# Altium schematic symbol library lib_datalogger.SchLib: 1246 symbols (part 14 of 16)
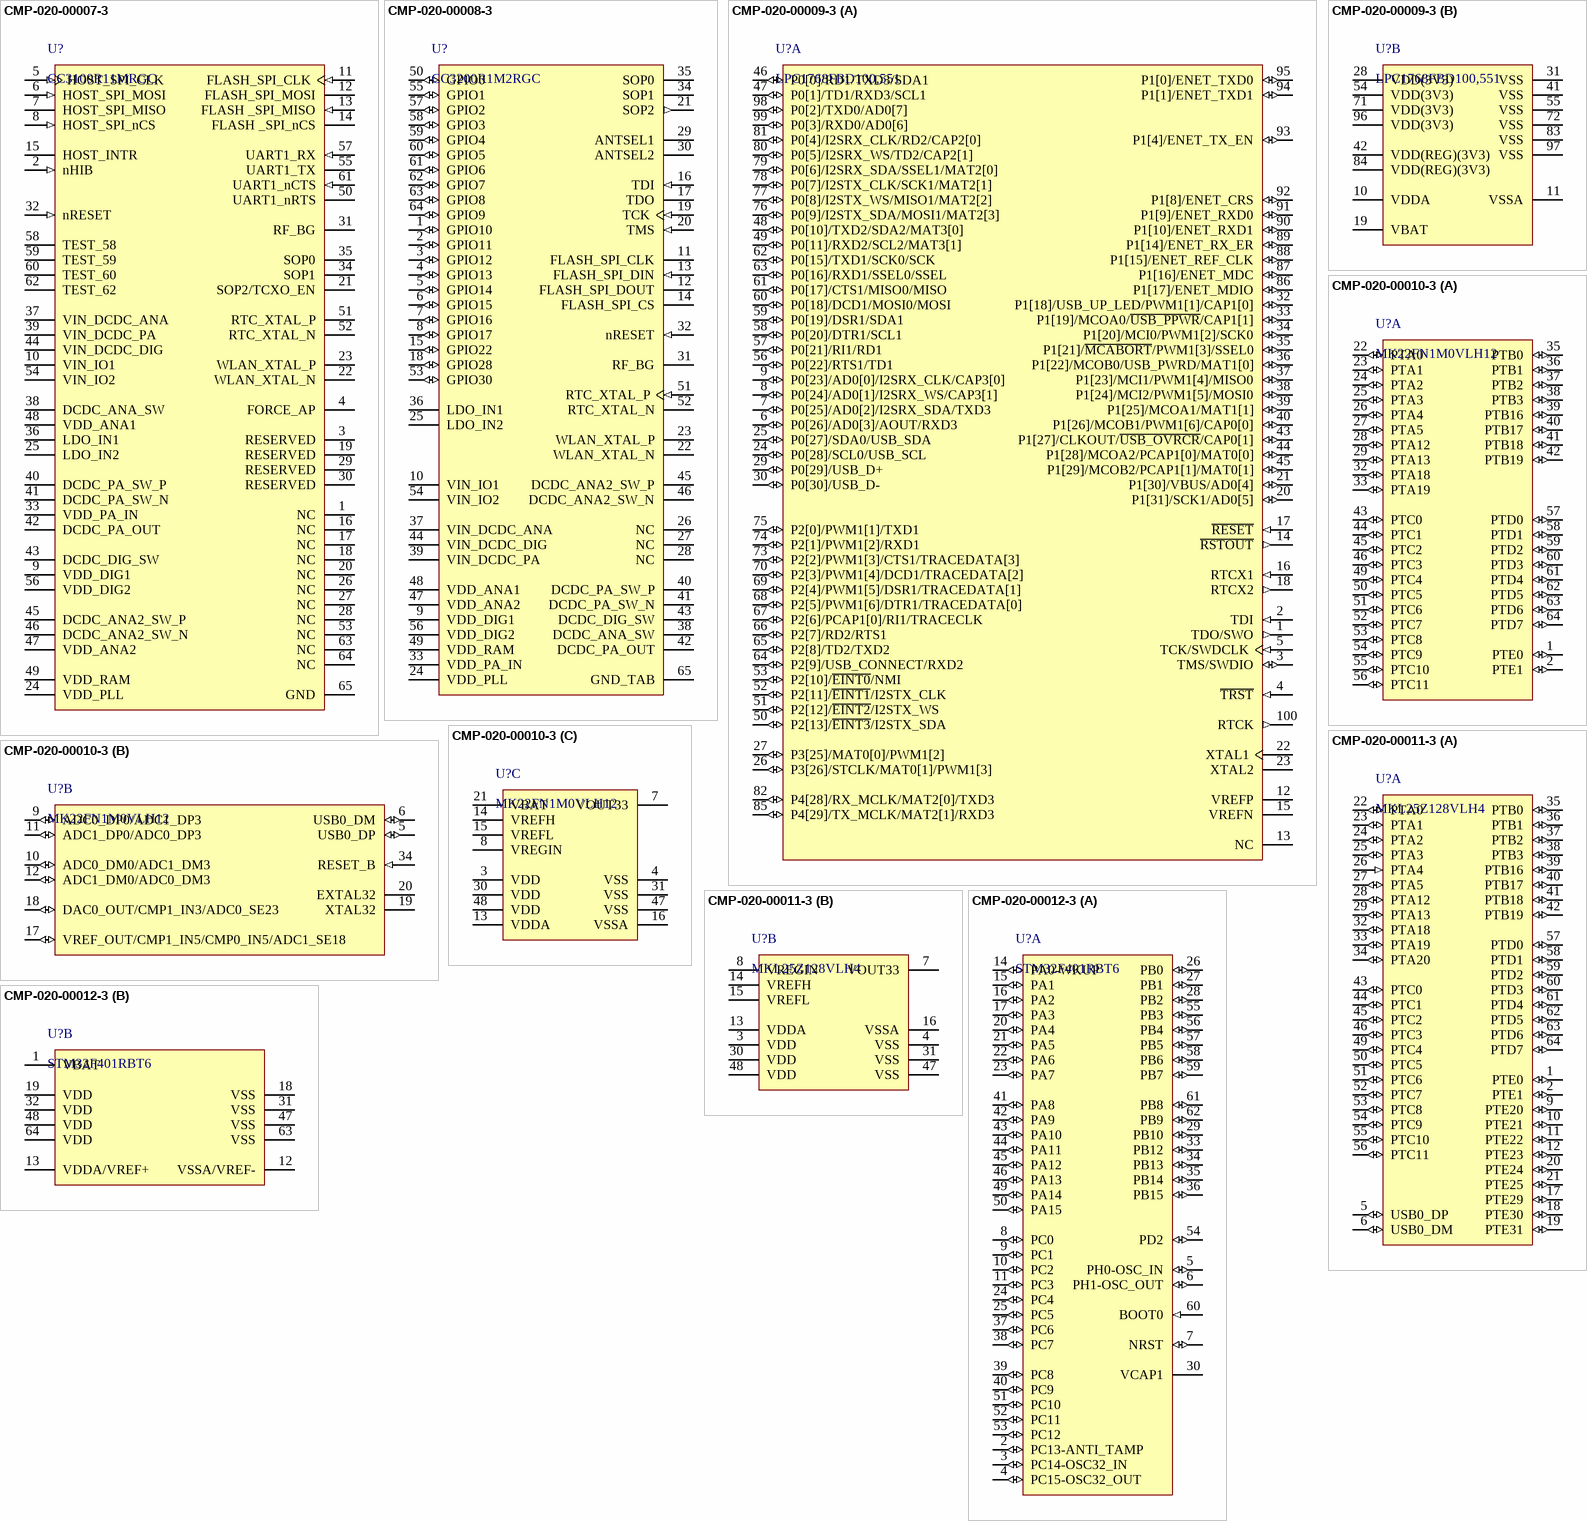
[diagram p56: symbols CMP-020-00007-3 to CMP-020-00012-3]

## CMP-020-00010-3
designator U?, comment MK22FN1M0VLH12
Kinetis K22F Sub-Family, 120 MHz ARM(R) Cortex(R)-M4-based Microcontroller with FPU, 1.71 to 3.6 V, -40 to 105 degC, 64-Pin LQFP, RoHS, Tray; Manufacturer: Freescale; Max Supply Voltage: 3.6V; Density: 1MB; Package Version: Rev. G, 01/2016; RAM Size: 128KB; Max Clock Frequency: 120MHz; Interface: UART; Min Supply Voltage: 1.71V; Datasheet Version: Rev. 4, 11/2014; Package Quantity: 160; Package Reference: LQFP-64; Package Description: 64-Pin Low-profile Quad Flat Package, Body 10 x 10 mm, Pitch 0.5 mm; Mounting Technology: SM; Max Operating Temperature: 105°C; Datasheet URL: http://cache.nxp.com/files/32bit/doc/data_sheet/K22P64M120SF5.pdf; Min Operating Temperature: -40°C; RoHS Compliant: True; Case/Package: LQFP; Packaging: Tray; Package URL: http://cache.nxp.com/files/shared/doc/package_info/98ASS23234W.pdf?fsrch=1&sr=1&pageNum=1; Manufacturer URL: http://www.nxp.com/; Pins: 64
footprint FREE-LQFP-64_M (TSQFP, 64-Leads, Body 10.00x10.00mm, Pitch 0.50mm, IPC Low Density)
footprint FREE-LQFP-64_L (TSQFP, 64-Leads, Body 10.00x10.00mm, Pitch 0.50mm, IPC High Density)
footprint FREE-LQFP-64_N (TSQFP, 64-Leads, Body 10.00x10.00mm, Pitch 0.50mm, IPC Medium Density)
part A pins: 1 PTE0 (io) "ADC1_SE4A/UART1_TX/TRACE_CLKOUT/I2C1_SDA/RTC_CLKOUT", 2 PTE1 (io) "LLWU_P0/ADC1_SE5A/UART1_RX/TRACE_D3/I2C1_SCL", 22 PTA0 (io) "UART0_CTS_B/FTM0_CH5/JTAG_TCLK/SWD_CLK/EZP_CLK", 23 PTA1 (io) "UART0_RX/FTM0_CH6/JTAG_TDI/EZP_DI", 24 PTA2 (io) "UART0_TX/FTM0_CH7/JTAG_TDO/TRACE_SWO/EZP_DO", 25 PTA3 (io) "UART0_RTS_B/FTM0_CH0/JTAG_TMS/SWD_DIO", 26 PTA4 (io) "LLWU_P3/FTM0_CH1/NMI_B/EZP_CS_B", 27 PTA5 (io) "USB_CLKIN/FTM0_CH2/CMP2_OUT/2S0_TX_BCLK/JTAG_TRST_B", 28 PTA12 (io) "CMP2_IN0/CAN0_TX/FTM1_CH0/I2C2_SCL/I2S0_TXD0/FTM1_QD_PHA", 29 PTA13 (io) "LLWU_P4/CMP2_IN1/CAN0_RX/FTM1_CH1/I2C2_SDA/I2S0_TX_FS/FTM1_QD_PHB", 32 PTA18 (io) "EXTAL0/FTM0_FLT2/FTM_CLKIN0", 33 PTA19 (io) "XTAL0/FTM1_FLT0/FTM_CLKIN1/LPTMR0_ALT1", 35 PTB0 (io) "LLWU_P5/ADC0_SE8/ADC1_SE8/I2C0_SCL/FTM1_CH0/FTM1_QD_PHA", 36 PTB1 (io) "ADC0_SE9/ADC1_SE9/PTB1/I2C0_SDA/FTM1_CH1/FTM1_QD_PHB", 37 PTB2 (io) "ADC0_SE12/I2C0_SCL/UART0_RTS_B/FTM0_FLT3", 38 PTB3 (io) "ADC0_SE13/I2C0_SDA/UART0_CTS_B/FTM0_FLT0", 39 PTB16 (io) "UART0_RX/FTM_CLKIN0/FB_AD17/EWM_IN", 40 PTB17 (io) "UART0_TX/FTM_CLKIN1/FB_AD16/EWM_OUT_B", 41 PTB18 (io) "CAN0_TX/FTM2_CH0/I2S0_TX_BCLK/FB_AD15/FTM2_QD_PHA", 42 PTB19 (io) "CAN0_RX/FTM2_CH1/I2S0_TX_FS/FB_OE_B/FTM2_QD_PHB", 43 PTC0 (io) "ADC0_SE14/SPI0_PCS4/PDB0_EXTRG/FB_AD14/I2S0_TXD1", 44 PTC1 (io) "LLWU_P6/ADC0_SE15/SPI0_PCS3/UART1_RTS_B/ FTM0_CH0/FB_AD13/I2S0_TXD0", 45 PTC2 (io) "ADC0_SE4B/CMP1_IN0/SPI0_PCS2/UART1_CTS_B/FTM0_CH1/FB_AD12/I2S0_TX_FS", 46 PTC3 (io) "LLWU_P7/CMP1_IN1/SPI0_PCS1/UART1_RX/FTM0_CH2/CLKOUT/I2S0_TX_BCLK", 49 PTC4 (io) "LLWU_P8/SPI0_PCS0/UART1_TX/FTM0_CH3/FB_AD11/CMP1_OUT", 50 PTC5 (io) "LLWU_P9/SPI0_SCK/LPTMR0_ALT2/I2S0_RXD0/FB_AD10/CMP0_OUT/FTM0_CH2", 51 PTC6 (io) "LLWU_P10/CMP0_IN0/SPI0_SOUT/PDB0_EXTRG/I2S0_RX_BCLK/FB_AD9/I2S0_MCLK", 52 PTC7 (io) "CMP0_IN1/SPI0_SIN/USB_SOF_OUT/I2S0_RX_FS/FB_AD8", 53 PTC8 (io) "ADC1_SE4B/CMP0_IN2/FTM3_CH4/I2S0_MCLK/FB_AD7", 54 PTC9 (io) "ADC1_SE5B/CMP0_IN3/FTM3_CH5/I2S0_RX_BCLK/FB_AD6/FTM2_FLT0", 55 PTC10 (io) "ADC1_SE6B/I2C1_SCL/FTM3_CH6/I2S0_RX_FS/FB_AD5", 56 PTC11 (io) "LLWU_P11/ADC1_SE7B/I2C1_SDA/FTM3_CH7/I2S0_RXD1/FB_RW_B", 57 PTD0 (io) "LLWU_P12/SPI0_PCS0/UART2_RTS_B/FTM3_CH0/FB_ALE/FB_CS1_B/FB_TS_B", 58 PTD1 (io) "ADC0_SE5B/SPI0_SCK/UART2_CTS_B/FTM3_CH1/FB_CS0_B", 59 PTD2 (io) "LLWU_P13/SPI0_SOUT/UART2_RX/FTM3_CH2/FB_AD4/I2C0_SCL", 60 PTD3 (io) "SPI0_SIN/UART2_TX/FTM3_CH3/FB_AD3/I2C0_SDA", 61 PTD4 (io) "LLWU_P14/SPI0_PCS1/UART0_RTS_B/FTM0_CH4/FB_AD2/EWM_IN", 62 PTD5 (io) "ADC0_SE6B/SPI0_PCS2/UART0_CTS_ B/FTM0_CH5/FB_AD1/EWM_OUT_B", 63 PTD6 (io) "LLWU_P15/ADC0_SE7B/SPI0_PCS3/UART0_RX/FTM0_CH6/FB_AD0/FTM0_FLT0", 64 PTD7 (io) "CMT_IRO/UART0_TX/FTM0_CH7/FTM0_FLT1"
part B pins: 5 USB0_DP (io), 6 USB0_DM (io), 9 ADC0_DP0/ADC1_DP3 (io), 10 ADC0_DM0/ADC1_DM3 (io), 11 ADC1_DP0/ADC0_DP3 (io), 12 ADC1_DM0/ADC0_DM3 (io), 17 VREF_OUT/CMP1_IN5/CMP0_IN5/ADC1_SE18 (io), 18 DAC0_OUT/CMP1_IN3/ADC0_SE23 (io), 19 XTAL32, 20 EXTAL32, 34 RESET_B (in)
part C pins: 3 VDD (power) "Digital supply voltage", 4 VSS (power), 7 VOUT33 (power), 8 VREGIN (power) "Input supply voltage", 13 VDDA (power) "Analog supply voltage", 14 VREFH (power) "ADC reference  voltage high", 15 VREFL (power) "ADC reference  voltage low", 16 VSSA (power), 21 VBAT (power) "RTC battery supply voltage", 30 VDD (power) "Digital supply voltage", 31 VSS (power), 47 VSS (power), 48 VDD (power) "Digital supply voltage"

## CMP-020-00011-3
designator U?, comment MKL25Z128VLH4
48 MHz Cortex-M0+ Based Microcontroller with USB, 1.71 to 3.6 V, -40 to 105 degC, 64-Pin LQFP, RoHS, Tray; Manufacturer: Freescale; I/Os: 50; Package Version: Rev. G, 01/2016; Frequency: 48MHz; Max Supply Voltage: 3.6V; Density: 128KB; ADC Channels: 14; Min Supply Voltage: 1.71V; PWM Channels: 6; Interface: UART; RAM Size: 16KB; Package Description: 64-Pin Low-profile Quad Flat Package, Body 10 x 10 mm, Pitch 0.5 mm; Package Quantity: 160; RoHS Compliant: True; Package Reference: LQFP-64; Min Operating Temperature: -40°C; Package URL: http://cache.nxp.com/files/shared/doc/package_info/98ASS23234W.pdf?fsrch=1&sr=1&pageNum=1; Packaging: Tray; Max Operating Temperature: 105°C; Pins: 64; Max Clock Frequency: 48MHz; Manufacturer URL: http://www.nxp.com/; Case/Package: LQFP; Datasheet URL: http://cache.freescale.com/files/32bit/doc/data_sheet/KL25P80M48SF0.pdf; Datasheet Version: Rev. 5, 08/2014; Mounting Technology: SM
footprint FREE-LQFP-64_M (TSQFP, 64-Leads, Body 10.00x10.00mm, Pitch 0.50mm, IPC Low Density)
footprint FREE-LQFP-64_L (TSQFP, 64-Leads, Body 10.00x10.00mm, Pitch 0.50mm, IPC High Density)
footprint FREE-LQFP-64_N (TSQFP, 64-Leads, Body 10.00x10.00mm, Pitch 0.50mm, IPC Medium Density)
part A pins: 1 PTE0 (io) "UART1_TX/RTC_CLKOUT/CMP0_OUT/I2C1_SDA", 2 PTE1 (io) "SPI1_MOSI/UART1_RX/SPI1_MISO/I2C1_SCL", 5 USB0_DP (io), 6 USB0_DM (io), 9 PTE20 (io) "ADC0_DP0/ADC0_SE0/TPM1_CH0/UART_TX", 10 PTE21 (io) "ADC0_DM0/ADC_SE4A/TPM1_CH1/UART0_RX", 11 PTE22 (io) "ADC0_DP3/ADC0_SE3/TPM2_CH0/UART2_TX", 12 PTE23 (io) "ADC0_DP3/ADC0_SE7A/TPM2_CH1/UART_RX", 17 PTE29 (io) "CMP0_IN5/ADC0_SE4B/TPM0_CH2/TPM_CLKIN0", 18 PTE30 (io) "DAC0_OUT/ADC0_SE23/CMP0_IN4/TPM0_CH3/TPM_CLKIN1", 19 PTE31 (io) "TPM0_CH4", 20 PTE24 (io) "TPM0_CH0/I2C0_SCL", 21 PTE25 (io) "TPM0_CH1/I2C0_SDA", 22 PTA0 (io) "TSI0_CH1/TPM0_CH5/SWD_CLK", 23 PTA1 (io) "TSI0_CH2/UART0_RX/TPM2_CH0", 24 PTA2 (io) "TSI0_CH3/UART0_TX/TPM2_CH1", 25 PTA3 (io) "TSI0_CH4/I2C1_SCL/TPM0_CH0/SWD_DIO", 26 PTA4 (in) "TSI0_CH5/I2C1_SDA/TPM0_CH1/NMI_B", 27 PTA5 (io) "USB_CLKIN/TPM0_CH2", 28 PTA12 (io) "TPM1_CH0", 29 PTA13 (io) "TPM1_CH1", 32 PTA18 (io) "EXTAL0/UART1_RX/TPM_CLKIN0", 33 PTA19 (io) "XTAL0/UART1_TX/TPM_CLKIN1/LPTMR0_ALT1", 34 PTA20 (io) "RESET_B", 35 PTB0 (io) "LLWU_P5/ADC0_SE8/TSI0_CH0/I2C0_SCL/TPM1_CH0", 36 PTB1 (io) "ADC0_SE9/TSI0_CH6/I2C0_SDA/TPM1_CH1", 37 PTB2 (io) "ADC0_SE12/TSI0_CH7/I2C0_SCL/TPM2_CH0", 38 PTB3 (io) "ADC0_SE13/TSI0_CH8/I2C0_SDA/TPM2_CH1", 39 PTB16 (io) "TSI0_CH9/SPI1_MOSI/UART0_RX/TPM_CLKIN0/SPI1_MISO", 40 PTB17 (io) "TSI0_CH10/SPI1_MISO/UART0_TX/TPM_CLKIN1/SPI1_MOSI", 41 PTB18 (io) "TSI0_CH11/TPM2_CH0", 42 PTB19 (io) "TSI0_CH12/TPM2_CH1", 43 PTC0 (io) "ADC0_SE14/TSI0_CH13/EXTRG_IN/CMP0_OUT", 44 PTC1 (io) "LLWU_P6/RTC_CLKIN/ADC0_SE15/TSI0_CH14/I2C1_SCL/TPM0_CH0", 45 PTC2 (io) "ADC0_SE11/TSI0_CH15/I2C1_SDA/TPM0_CH1", 46 PTC3 (io) "LLWU_P7/UART1_RX/TPM0_CH2/CLKOUT", 49 PTC4 (io) "LLWU_P8/SPI0_PCS0/UART1_TX/TPM0_CH3", 50 PTC5 (io) "LLWU_P9/SPI0_SCK/LPTMR0_ALT2/CMP0_OUT", 51 PTC6 (io) "LLWU_P10/CMP0_IN0/SPI0_MOSI/EXTRG_IN/SPI0_MISO", 52 PTC7 (io) "CMP0_IN1/SPI0_MISO/SPI0_MOSI", 53 PTC8 (io) "CMP0_IN2/I2C0_SCL/TPM0_CH4", 54 PTC9 (io) "CMP0_IN3/I2C0_SDA/TPM0_CH5", 55 PTC10 (io) "I2C1_SCL", 56 PTC11 (io) "I2C1_SDA", 57 PTD0 (io) "SPI0_PCS0/TPM0_CH0", 58 PTD1 (io) "ADC0_SE5B/PTD1/SPI0_SCK/TPM0_CH1", 59 PTD2 (io) "SPI0_MOSI/UART2_RX/TPM0_CH2/SPI0_MISO", 60 PTD3 (io) "SPI0_MISO/UART2_TX/TPM0_CH3/SPI0_MOSI", 61 PTD4 (io) "LLWU_P14/SPI1_PCS0/UART2_RX/TPM0_CH4", 62 PTD5 (io) "ADC0_SE6B/SPI1_SCK/UART2_TX/TPM0_CH5", 63 PTD6 (io) "LLWU_P15/ADC0_SE7B/SPI1_MOSI/UART0_RX/SPI1_MISO", 64 PTD7 (io) "SPI1_MISO/UART0_TX/SPI1_MOSI"
part B pins: 3 VDD (power) "Digital supply voltage", 4 VSS (power), 7 VOUT33 (power), 8 VREGIN (power) "USB regulator input", 13 VDDA (power) "Analog supply voltage", 14 VREFH (power) "ADC reference  voltage high", 15 VREFL (power) "ADC reference  voltage low", 16 VSSA (power), 30 VDD (power) "Digital supply voltage", 31 VSS (power), 47 VSS (power), 48 VDD (power) "Digital supply voltage"

## CMP-020-00012-3
designator U?, comment STM32F401RBT6
ARM Cortex -M4 32b MCU+FPU, 256 KB Flash, 64 KB RAM, -40 to 85 degC, 64-Pin LQFP, RoHS, Tray; Manufacturer: STMicroelectronics; Frequency: 84MHz; Interface: USART; Power: 313mW; Max Supply Voltage: 3.6V; RAM Size: 64KB; I/Os: 50; Density: 128KB; Min Supply Voltage: 1.8V; Datasheet URL: http://www.st.com/st-web-ui/static/active/en/resource/technical/document/datasheet/DM00086815.pdf; Package Quantity: 160; Package Description: 64-Pin Low-profile Quad Flat Package, Body 10 x 10 mm, Pitch 0.5 mm; Packaging: Tray; Case/Package: LQFP; Pins: 64; Mounting Technology: SM; RoHS Compliant: True; Datasheet Version: Rev. 5, 08/2015; Manufacturer URL: http://www.st.com/; Package Reference: LQFP64
footprint STM-LQFP64_L (Thin QFP, 64-Leads, Body 10x10mm, Pitch 0.5mm, IPC High Density)
footprint STM-LQFP64_M (Thin QFP, 64-Leads, Body 10x10mm, Pitch 0.5mm, IPC Low Density)
footprint STM-LQFP64_N (Thin QFP, 64-Leads, Body 10x10mm, Pitch 0.5mm, IPC Medium Density)
part A pins: 2 PC13-ANTI_TAMP (io) "PC13-ANTI_TAMP/TAMP_1", 3 PC14-OSC32_IN (io) "PC14-OSC32_IN/OSC32_IN", 4 PC15-OSC32_OUT (io) "PC15-OSC32_OUT/OSC32_OUT", 5 PH0-OSC_IN (io) "PH0-OSC_IN/OSC_IN", 6 PH1-OSC_OUT (io) "PH1-OSC_OUT/OSC_OUT", 7 NRST (io), 8 PC0 (io) "PC0/ADC1_10", 9 PC1 (io) "PC1/ADC1_11", 10 PC2 (io) "PC2/SPI2_MISO,I2S2ext_SD/ADC1_12", 11 PC3 (io) "PC3/SPI2_MOSI/I2S2_SD/ADC1_13", 14 PA0-WKUP (io) "PA0-WKUP/USART2_CTS,TIM2_CH1/TIM2_ETR,TIM5_CH1/ADC1_0,WKUP", 15 PA1 (io) "PA1/USART2_RTS,TIM2_CH2,TIM5_CH2/ADC1_1", 16 PA2 (io) "PA2/USART2_TX,TIM2_CH3,TIM5_CH3,TIM9_CH1/ADC1_2", 17 PA3 (io) "PA3/USART2_RX,TIM2_CH4,TIM5_CH4,TIM9_CH2/ADC1_3", 20 PA4 (io) "PA4/SPI1_NSS,SPI3_NSS/I2S3_WS,USART2_CK/ADC1_4", 21 PA5 (io) "PA5/SPI1_SCK,TIM2_CH1/TIM2_ETR/ADC1_5", 22 PA6 (io) "PA6/SPI1_MISO,TIM1_BKIN,TIM3_CH1/ADC1_6", 23 PA7 (io) "PA7/SPI1_MOSI,TIM1_CH1N,TIM3_CH2/ADC1_7", 24 PC4 (io) "PC4/ADC1_14", 25 PC5 (io) "PC5/ADC1_15", 26 PB0 (io) "PB0/TIM1_CH2N,TIM3_CH3/ADC1_8", 27 PB1 (io) "PB1/TIM1_CH3N,TIM3_CH4/ADC1_9", 28 PB2 (io), 29 PB10 (io) "PB10/SPI2_SCK/I2S2_CK,I2C2_SCL,TIM2_CH3", 30 VCAP1 (power), 33 PB12 (io) "PB12/SPI2_NSS/I2S2_WS,I2C2_SMBAL,TIM1_BKIN", 34 PB13 (io) "PB13/SPI2_SCK/I2S2_CK,TIM1_CH1N", 35 PB14 (io) "PB14/SPI2_MISO,I2S2ext_SD,TIM1_CH2N", 36 PB15 (io) "PB15/SPI2_MOSI/I2S2_SD,TIM1_CH3N,RTC_50Hz", 37 PC6 (io) "PC6/I2S2_MCK,USART6_TX,TIM3_CH1,SDIO_D6", 38 PC7 (io) "PC7/I2S3_MCK,USART6_RX,TIM3_CH2,SDIO_D7", 39 PC8 (io) "PC8/USART6_CK,TIM3_CH3,SDIO_D0", 40 PC9 (io) "PC9/I2S2_CKIN,I2C3_SDA,TIM3_CH4,SDIO_D1,MCO_2", 41 PA8 (io) "PA8/I2C3_SCL,USART1_CK,TIM1_CH1,USB_FS_SOF,MCO_1", 42 PA9 (io) "PA9/I2C3_SMBAL,USART1_TX,TIM1_CH2,USB_FS_VBUS", 43 PA10 (io) "PA10/USART1_RX,TIM1_CH3,USB_FS_ID", 44 PA11 (io) "PA11/USART1_CTS,USART6_TX,TIM1_CH4,USB_FS_DM", 45 PA12 (io) "PA12/USART1_RTS,USART6_RX,TIM1_ETR,USB_FS_DP", 46 PA13 (io) "PA13/JTMS-SWDIO", 49 PA14 (io) "PA14/JTCK-SWCLK", 50 PA15 (io) "PA15/SPI1_NSS,SPI3_NSS/I2S3_WS,TIM2_CH1/TIM2_ETR,JTDI", 51 PC10 (io) "PC10/SPI3_SCK/I2S3_CK,SDIO_D2", 52 PC11 (io) "PC11/I2S3ext_SD,SPI3_MISO,SDIO_D3", 53 PC12 (io) "PC12/SPI3_MOSI/I2S3_SD,SDIO_CK", 54 PD2 (io) "PD2/TIM3_ETR,SDIO_CMD", 55 PB3 (io) "PB3/SPI1_SCK,SPI3_SCK/I2S3_CK,I2C2_SDA,TIM2_CH2,JTDO-SWO", 56 PB4 (io) "PB4/SPI1_MISO,SPI3_MISO,I2S3ext_SD,I2C3_SDA,TIM3_CH1,JTRST", 57 PB5 (io) "PB5/SPI1_MOSI,SPI3_MOSI/I2S3_SD,I2C1_SMBAL,TIM3_CH2", 58 PB6 (io) "PB6/I2C1_SCL,USART1_TX,TIM4_CH1", 59 PB7 (io) "PB7/I2C1_SDA,USART1_RX,TIM4_CH2", 60 BOOT0 (in), 61 PB8 (io) "PB8/I2C1_SCL,TIM4_CH3,TIM10_CH1,SDIO_D4", 62 PB9 (io) "PB9/SPI2_NSS/I2S2_WS,I2C1_SDA,TIM4_CH4,TIM11_CH1,SDIO_D5"
part B pins: 1 VBAT (power), 12 VSSA/VREF- (power), 13 VDDA/VREF+ (power), 18 VSS (power), 19 VDD (power), 31 VSS (power), 32 VDD (power), 47 VSS (power), 48 VDD (power), 63 VSS (power), 64 VDD (power)

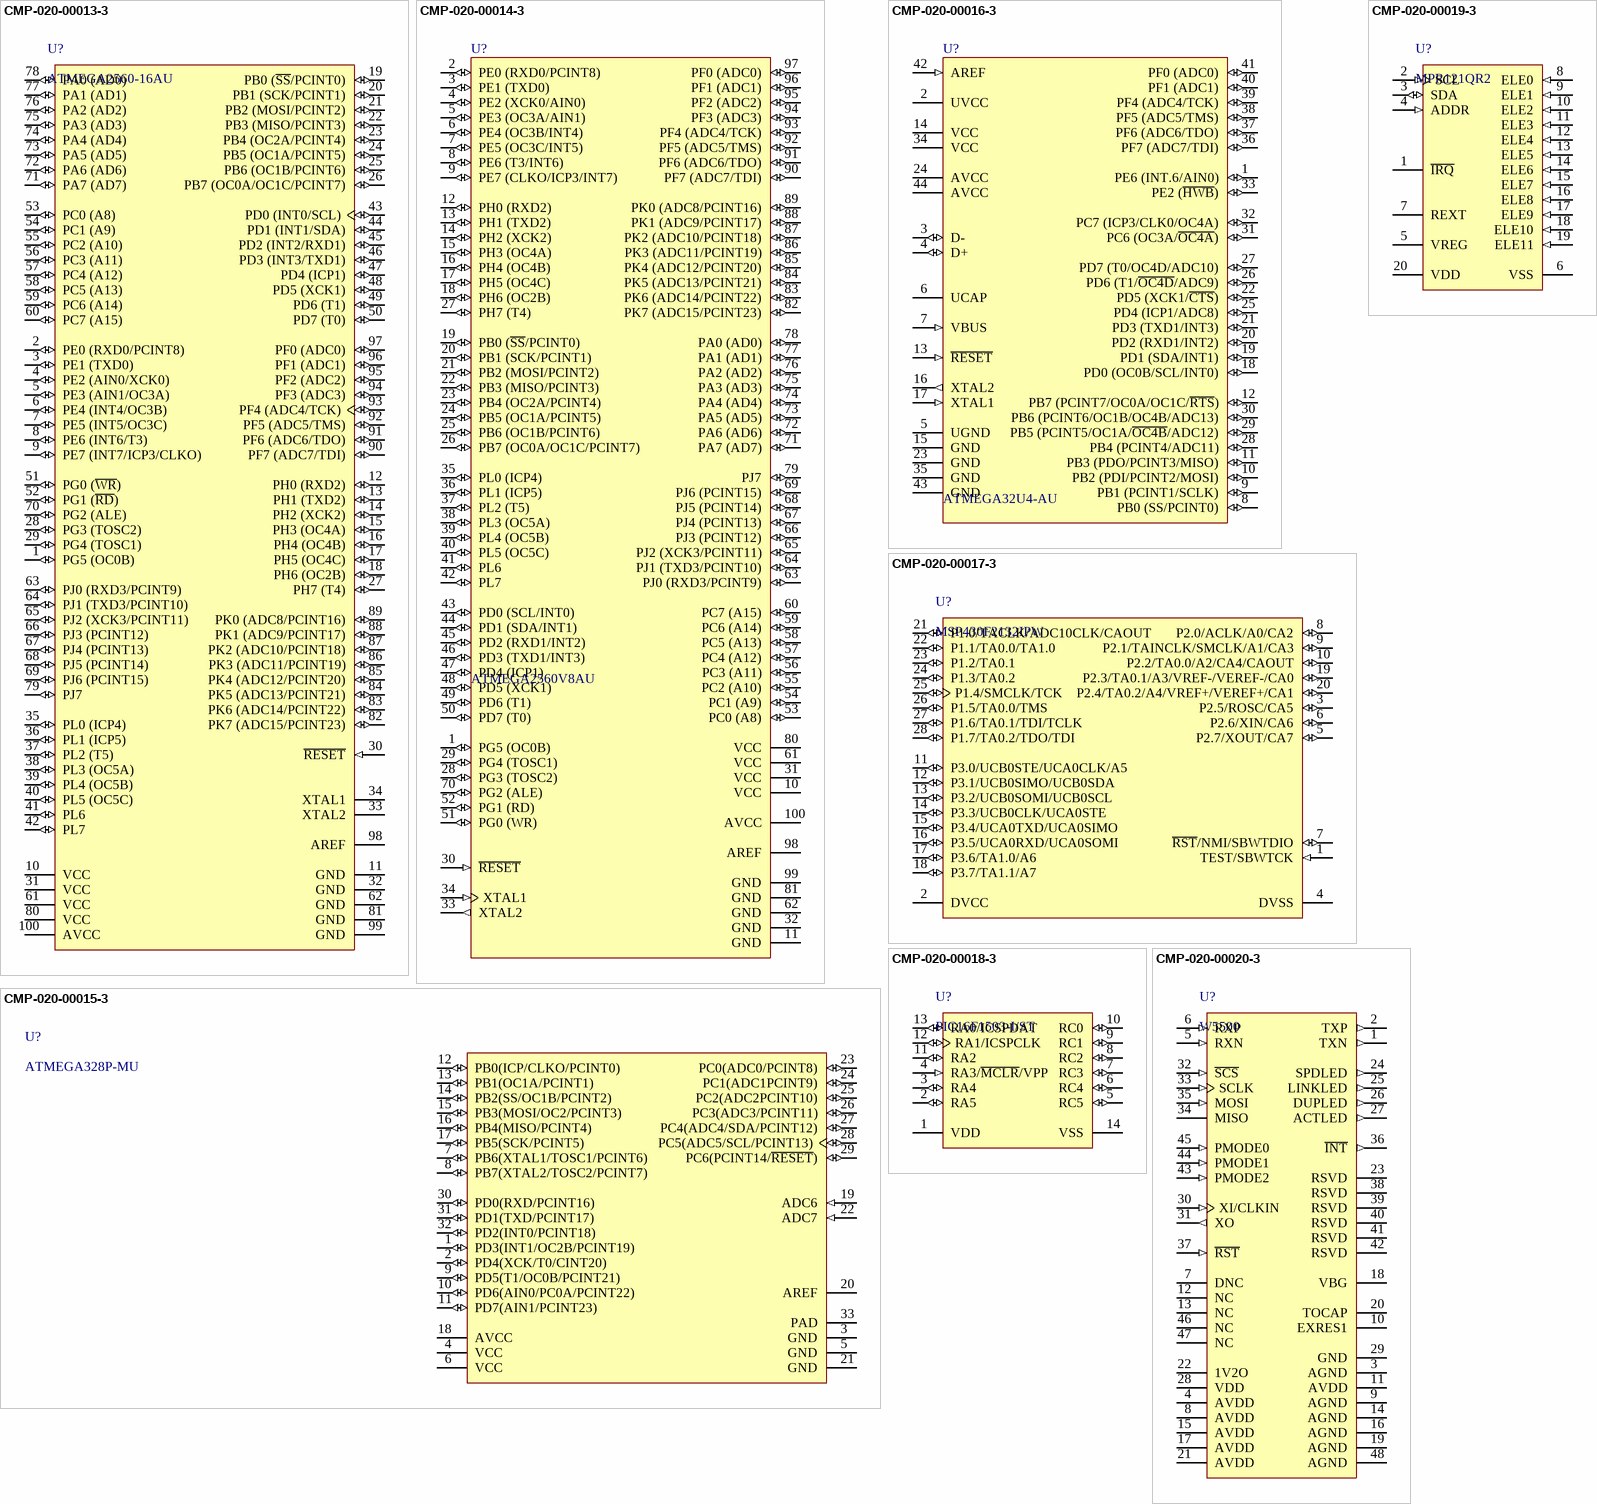
[diagram p39: symbols CMP-020-00013-3 to CMP-020-00020-3]

## CMP-020-00013-3
designator U?, comment ATMEGA2560-16AU
Atmel Microcontroller with 256 KB In-System Programmable Flash, 8-Bit , 4.5 to 5.5 V, -40 to 85 degC, 100-Pin QFP, Pb-Free, Tape and Reel; Density: 256KB; Max Clock Frequency: 16MHz; PWM Channels: 12; ADC Channels: 16; Nominal Supply Voltage: 5V; Interface: USART; Max Supply Voltage: 5.5V; Min Supply Voltage: 4.5V; I/Os: 86; Ethernet Channels: 0; RAM Size: 8KB; Datasheet URL: http://www.atmel.com/images/atmel-2549-8-bit-avr-microcontroller-atmega640-1280-1281-2560-2561_summary.pdf; Package Reference: 100A; RoHS Compliant: True; Pins: 100; Min Operating Temperature: -40°C; Max Operating Temperature: 85°C; Manufacturer: Atmel; Datasheet Version: Feb-14; Frequency: 16MHz; Package Quantity: 90; Packaging: Tray; Manufacturer URL: http://www.atmel.com/; Mounting Technology: SM; USB Channels: 0; Case/Package: TQFP; Package Description: 100-Pin Thin Profile Plastic Quad Flat Package, Body 14 x 14 mm, Pitch 0.5 mm
footprint ATML-100A_L (TQFP, 100-Leads, Body 14x14mm, Pitch 0.5mm, IPC High Density)
footprint ATML-100A_N (TQFP, 100-Leads, Body 14x14mm, Pitch 0.5mm, IPC Medium Density)
footprint ATML-100A_M (TQFP, 100-Leads, Body 14x14mm, Pitch 0.5mm, IPC Low Density)
pins: 1 PG5 (OC0B) (io), 2 PE0 (RXD0/PCINT8) (io), 3 PE1 (TXD0) (io), 4 PE2 (AIN0/XCK0) (io), 5 PE3 (AIN1/OC3A) (io), 6 PE4 (INT4/OC3B) (io), 7 PE5 (INT5/OC3C) (io), 8 PE6 (INT6/T3) (io), 9 PE7 (INT7/ICP3/CLKO) (io), 10 VCC (power) "Digital supply voltage", 11 GND (power) "Ground.", 12 PH0 (RXD2) (io), 13 PH1 (TXD2) (io), 14 PH2 (XCK2) (io), 15 PH3 (OC4A) (io), 16 PH4 (OC4B) (io), 17 PH5 (OC4C) (io), 18 PH6 (OC2B) (io), 19 PB0 (~{SS}/PCINT0) (io), 20 PB1 (SCK/PCINT1) (io), 21 PB2 (MOSI/PCINT2) (io), 22 PB3 (MISO/PCINT3) (io), 23 PB4 (OC2A/PCINT4) (io), 24 PB5 (OC1A/PCINT5) (io), 25 PB6 (OC1B/PCINT6) (io), 26 PB7 (OC0A/OC1C/PCINT7) (io), 27 PH7 (T4) (io), 28 PG3 (TOSC2) (io), 29 PG4 (TOSC1) (io), 30 ~{RESET} (in) "Reset input. A low level on this pin for longer than the minimum pulse length will generate a reset, even if the clock is not running. The minimum pulse length is given in “System and Reset Characteristics” on page 360. Shorter pulses are not guaranteed to generate a reset.", 31 VCC (power) "Digital supply voltage", 32 GND (power) "Ground.", 33 XTAL2 "Output from the inverting Oscillator amplifier.", 34 XTAL1 "Input to the inverting Oscillator amplifier and input to the internal clock operating circuit.", 35 PL0 (ICP4) (io), 36 PL1 (ICP5) (io), 37 PL2 (T5) (io), 38 PL3 (OC5A) (io), 39 PL4 (OC5B) (io), 40 PL5 (OC5C) (io), 41 PL6 (io) "Port L is a 8-bit bi-directional I/O port with internal pull-up resistors (selected for each bit). The Port L output buffers have symmetrical drive characteristics with both high sink and source capability. As inputs, Port L pins that are externally pulled low will source current if the pull-up resistors are activated. The Port L pins are tri-stated when a reset condition becomes active, even if the clock is not running. Port L also serves the functions of various special features of the ATmega640/1280/2560 as listed on page 94.", 42 PL7 (io) "Port L is a 8-bit bi-directional I/O port with internal pull-up resistors (selected for each bit). The Port L output buffers have symmetrical drive characteristics with both high sink and source capability. As inputs, Port L pins that are externally pulled low will source current if the pull-up resistors are activated. The Port L pins are tri-stated when a reset condition becomes active, even if the clock is not running. Port L also serves the functions of various special features of the ATmega640/1280/2560 as listed on page 94.", 43 PD0 (INT0/SCL) (io), 44 PD1 (INT1/SDA) (io), 45 PD2 (INT2/RXD1) (io), 46 PD3 (INT3/TXD1) (io), 47 PD4 (ICP1) (io), 48 PD5 (XCK1) (io), 49 PD6 (T1) (io), 50 PD7 (T0) (io), 51 PG0 (~{WR}) (io), 52 PG1 (~{RD}) (io), 53 PC0 (A8) (io), 54 PC1 (A9) (io), 55 PC2 (A10) (io), 56 PC3 (A11) (io), 57 PC4 (A12) (io), 58 PC5 (A13) (io), 59 PC6 (A14) (io), 60 PC7 (A15) (io), 61 VCC (power) "Digital supply voltage", 62 GND (power) "Ground.", 63 PJ0 (RXD3/PCINT9) (io), 64 PJ1 (TXD3/PCINT10) (io), 65 PJ2 (XCK3/PCINT11) (io), 66 PJ3 (PCINT12) (io), 67 PJ4 (PCINT13) (io), 68 PJ5 (PCINT14) (io), 69 PJ6 (PCINT15) (io), 70 PG2 (ALE) (io), 71 PA7 (AD7) (io), 72 PA6 (AD6) (io), 73 PA5 (AD5) (io), 74 PA4 (AD4) (io), 75 PA3 (AD3) (io), 76 PA2 (AD2) (io), 77 PA1 (AD1) (io), 78 PA0 (AD0) (io), 79 PJ7 (io) "Port J is a 8-bit bi-directional I/O port with internal pull-up resistors (selected for each bit). The Port J output buffers have symmetrical drive characteristics with both high sink and source capability. As inputs, Port J pins that are externally pulled low will source current if the pull-up resistors are activated. The Port J pins are tri-stated when a reset condition becomes active, even if the clock is not running. Port J also serves the functions of various special features of the ATmega640/1280/2560 as listed on page 90.", 80 VCC (power) "Digital supply voltage", 81 GND (power) "Ground.", 82 PK7 (ADC15/PCINT23) (io), 83 PK6 (ADC14/PCINT22) (io), 84 PK5 (ADC13/PCINT21) (io), 85 PK4 (ADC12/PCINT20) (io), 86 PK3 (ADC11/PCINT19) (io), 87 PK2 (ADC10/PCINT18) (io), 88 PK1 (ADC9/PCINT17) (io), 89 PK0 (ADC8/PCINT16) (io), 90 PF7 (ADC7/TDI) (io), 91 PF6 (ADC6/TDO) (io), 92 PF5 (ADC5/TMS) (io), 93 PF4 (ADC4/TCK) (io), 94 PF3 (ADC3) (io), 95 PF2 (ADC2) (io), 96 PF1 (ADC1) (io), 97 PF0 (ADC0) (io), 98 AREF "This is the analog reference pin for the A/D Converter.", 99 GND (power) "Ground.", 100 AVCC (power) "AVCC is the supply voltage pin for Port F and the A/D Converter. It should be externally connected to VCC, even if the ADC is not used. If the ADC is used, it should be connected to VCC through a low-pass filter."

## CMP-020-00014-3
designator U?, comment ATMEGA2560V8AU
Atmel Microcontroller, 8 bit, 256 KByte, 8 MHz, 1.8 to 5.5 V, 100-Pin TQFP, RoHS, Tape and Reel; Ethernet Channels: 0; I/Os: 86; Density: 256KB; ADC Channels: 16; Interface: USART; Max Clock Frequency: 8MHz; RAM Size: 8KB; Min Supply Voltage: 1.8V; Max Supply Voltage: 5.5V; Inputs: 86; Outputs: 86; Package Reference: 100A; Manufacturer: Atmel; RoHS Compliant: True; USB Channels: 0; Mounting Technology: SM; PWM Channels: 16; Manufacturer URL: http://www.atmel.com/; Datasheet Version: Rev. 2549Q, 02/2014; Case/Package: TQFP; Packaging: Tray; Min Operating Temperature: -40°C; Clock Frequency: 8MHz; Package Quantity: 90; Package Description: 100-Pin Thin Profile Plastic Quad Flat Package, Body 14 x 14 mm, Pitch 0.5 mm; Max Operating Temperature: 85°C; Datasheet URL: http://www.atmel.com/Images/Atmel-2549-8-bit-AVR-Microcontroller-ATmega640-1280-1281-2560-2561_datasheet.pdf; Frequency: 8MHz; Pins: 100; Programmable I/O: 86
footprint ATML-100A_L (TQFP, 100-Leads, Body 14x14mm, Pitch 0.5mm, IPC High Density)
footprint ATML-100A_N (TQFP, 100-Leads, Body 14x14mm, Pitch 0.5mm, IPC Medium Density)
footprint ATML-100A_M (TQFP, 100-Leads, Body 14x14mm, Pitch 0.5mm, IPC Low Density)
pins: 1 PG5 (OC0B) (io), 2 PE0 (RXD0/PCINT8) (io), 3 PE1 (TXD0) (io), 4 PE2 (XCK0/AIN0) (io), 5 PE3 (OC3A/AIN1) (io), 6 PE4 (OC3B/INT4) (io), 7 PE5 (OC3C/INT5) (io), 8 PE6 (T3/INT6) (io), 9 PE7 (CLKO/ICP3/INT7) (io), 10 VCC (power), 11 GND (power), 12 PH0 (RXD2) (io), 13 PH1 (TXD2) (io), 14 PH2 (XCK2) (io), 15 PH3 (OC4A) (io), 16 PH4 (OC4B) (io), 17 PH5 (OC4C) (io), 18 PH6 (OC2B) (io), 19 PB0 (~{SS}/PCINT0) (io), 20 PB1 (SCK/PCINT1) (io), 21 PB2 (MOSI/PCINT2) (io), 22 PB3 (MISO/PCINT3) (io), 23 PB4 (OC2A/PCINT4) (io), 24 PB5 (OC1A/PCINT5) (io), 25 PB6 (OC1B/PCINT6) (io), 26 PB7 (OC0A/OC1C/PCINT7) (io), 27 PH7 (T4) (io), 28 PG3 (TOSC2) (io), 29 PG4 (TOSC1) (io), 30 ~{RESET} (in), 31 VCC (power), 32 GND (power), 33 XTAL2 (out), 34 XTAL1 (in), 35 PL0 (ICP4) (io), 36 PL1 (ICP5) (io), 37 PL2 (T5) (io), 38 PL3 (OC5A) (io), 39 PL4 (OC5B) (io), 40 PL5 (OC5C) (io), 41 PL6 (io), 42 PL7 (io), 43 PD0 (SCL/INT0) (io), 44 PD1 (SDA/INT1) (io), 45 PD2 (RXD1/INT2) (io), 46 PD3 (TXD1/INT3) (io), 47 PD4 (ICP1) (io), 48 PD5 (XCK1) (io), 49 PD6 (T1) (io), 50 PD7 (T0) (io), 51 PG0 (WR) (io), 52 PG1 (RD) (io), 53 PC0 (A8) (io), 54 PC1 (A9) (io), 55 PC2 (A10) (io), 56 PC3 (A11) (io), 57 PC4 (A12) (io), 58 PC5 (A13) (io), 59 PC6 (A14) (io), 60 PC7 (A15) (io), 61 VCC (power), 62 GND (power), 63 PJ0 (RXD3/PCINT9) (io), 64 PJ1 (TXD3/PCINT10) (io), 65 PJ2 (XCK3/PCINT11) (io), 66 PJ3 (PCINT12) (io), 67 PJ4 (PCINT13) (io), 68 PJ5 (PCINT14) (io), 69 PJ6 (PCINT15) (io), 70 PG2 (ALE) (io), 71 PA7 (AD7) (io), 72 PA6 (AD6) (io), 73 PA5 (AD5) (io), 74 PA4 (AD4) (io), 75 PA3 (AD3) (io), 76 PA2 (AD2) (io), 77 PA1 (AD1) (io), 78 PA0 (AD0) (io), 79 PJ7 (io), 80 VCC (power), 81 GND (power), 82 PK7 (ADC15/PCINT23) (io), 83 PK6 (ADC14/PCINT22) (io), 84 PK5 (ADC13/PCINT21) (io), 85 PK4 (ADC12/PCINT20) (io), 86 PK3 (ADC11/PCINT19) (io), 87 PK2 (ADC10/PCINT18) (io), 88 PK1 (ADC9/PCINT17) (io), 89 PK0 (ADC8/PCINT16) (io), 90 PF7 (ADC7/TDI) (io), 91 PF6 (ADC6/TDO) (io), 92 PF5 (ADC5/TMS) (io), 93 PF4 (ADC4/TCK) (io), 94 PF3 (ADC3) (io), 95 PF2 (ADC2) (io), 96 PF1 (ADC1) (io), 97 PF0 (ADC0) (io), 98 AREF (power), 99 GND (power), 100 AVCC (power)

## CMP-020-00015-3
designator U?, comment ATMEGA328P-MU
MCU, 8-Bit, ATMEGA, 20 MHz, 1.8 to 5.5 V, -40 to 85 degC, 32-Pin QFN (32M1-A), RoHS; Manufacturer: Atmel; PWM Channels: 6; Frequency: 20MHz; Interface: USART; ADC Channels: 8; USB Channels: 0; RAM Size: 2KB; Min Supply Voltage: 1.8V; Max Supply Voltage: 5.5V; Density: 32KB; Package Version: Rev. E, 05/2006; I/Os: 23; Datasheet Version: Rev. 8271E, 07/2012; Package Description: 32-Pin Quad Flat No Lead Package, Body 5 x 5 mm, Pitch 0.5 mm, 3.1 x 3.1 mm Thermal Pad; Packaging: Tray; Package Reference: 32M1-A; Mounting Technology: SM; Package Quantity: 490; Ethernet Channels: 0; Pins: 32; RoHS Compliant: True; Max Operating Temperature: 85°C; Max Clock Frequency: 20MHz; Min Operating Temperature: -40°C; Case/Package: QFN; Manufacturer URL: http://www.atmel.com/; Clock Frequency: 20MHz; Datasheet URL: https://datasheet.ciiva.com/15122/getdatasheetpartid-130574-15122492.pdf
footprint ATML-32M1-A_D2-310_L (QFN, 32-Leads, Body 5.1x5.1mm, Pitch 0.5mm, Thermal Pad 3.1x3.1mm, IPC High Density)
footprint ATML-32M1-A_D2-310_M (QFN, 32-Leads, Body 5.1x5.1mm, Pitch 0.5mm, Thermal Pad 3.1x3.1mm, IPC Low Density)
footprint ATML-32M1-A_D2-310_N (QFN, 32-Leads, Body 5.1x5.1mm, Pitch 0.5mm, Thermal Pad 3.1x3.1mm, IPC Medium Density)
pins: 1 PD3(INT1/OC2B/PCINT19) (io), 2 PD4(XCK/T0/CINT20) (io), 3 GND (power), 4 VCC (power), 5 GND (power), 6 VCC (power), 7 PB6(XTAL1/TOSC1/PCINT6) (io), 8 PB7(XTAL2/TOSC2/PCINT7) (io), 9 PD5(T1/OC0B/PCINT21) (io), 10 PD6(AIN0/PC0A/PCINT22) (io), 11 PD7(AIN1/PCINT23) (io), 12 PB0(ICP/CLKO/PCINT0) (io), 13 PB1(OC1A/PCINT1) (io), 14 PB2(SS/OC1B/PCINT2) (io), 15 PB3(MOSI/OC2/PCINT3) (io), 16 PB4(MISO/PCINT4) (io), 17 PB5(SCK/PCINT5) (io), 18 AVCC (power), 19 ADC6 (in), 20 AREF, 21 GND (power), 22 ADC7 (in), 23 PC0(ADC0/PCINT8) (io), 24 PC1(ADC1PCINT9) (io), 25 PC2(ADC2PCINT10) (io), 26 PC3(ADC3/PCINT11) (io), 27 PC4(ADC4/SDA/PCINT12) (io), 28 PC5(ADC5/SCL/PCINT13) (io), 29 PC6(PCINT14/~{RESET}) (io), 30 PD0(RXD/PCINT16) (io), 31 PD1(TXD/PCINT17) (io), 32 PD2(INT0/PCINT18) (io), 33 PAD (power)

## CMP-020-00016-3
designator U?, comment ATMEGA32U4-AU
8-bit Microcontroller with 32 Kbytes of ISP Flash and USB Controller, 2.7 to 5.5 V, -40 to 85 degC, 44-Pin QFP, Tray; Manufacturer: Atmel; Max Supply Voltage: 5.5V; RAM Size: 2.5KB; Density: 32KB; ADC Channels: 12; I/Os: 26; Frequency: 16MHz; Interface: USART; PWM Channels: 8; Package Version: Rev. J, 02/2014; Ethernet Channels: 0; Min Supply Voltage: 2.7V; Package URL: http://www.atmel.com/images/atmel-7766-8-bit-avr-atmega16u4-32u4_summary.pdf; Manufacturer URL: http://www.atmel.com/; Max Operating Temperature: 85°C; Case/Package: TQFP; Pins: 44; Package Description: 44-Pin Thin Profile Plastic Quad Flat Papckage, Body 10 x 10 mm, Pitch 0.8 mm; Package Quantity: 800; Package Reference: 44ML; RoHS Compliant: True; Mounting Technology: SM; Max Clock Frequency: 16MHz; Packaging: Tray; Datasheet URL: http://www.atmel.com/images/atmel-7766-8-bit-avr-atmega16u4-32u4_summary.pdf; Datasheet Version: Rev. 7766IS, 07/2015; Min Operating Temperature: -40°C
footprint ATML-44ML_N (TQFP, 44-Leads, Body 10x10mm, Pitch 0.8mm, IPC Medium Density)
footprint ATML-44ML_L (TQFP, 44-Leads, Body 10x10mm, Pitch 0.8mm, IPC High Density)
footprint ATML-44ML_M (TQFP, 44-Leads, Body 10x10mm, Pitch 0.8mm, IPC Low Density)
pins: 1 PE6 (INT.6/AIN0) (io), 2 UVCC (power), 3 D- (io), 4 D+ (io), 5 UGND (power), 6 UCAP, 7 VBUS (in), 8 PB0 (SS/PCINT0) (io), 9 PB1 (PCINT1/SCLK) (io), 10 PB2 (PDI/PCINT2/MOSI) (io), 11 PB3 (PDO/PCINT3/MISO) (io), 12 PB7 (PCINT7/OC0A/OC1C/~{RTS}) (io), 13 ~{RESET} (in), 14 VCC (power), 15 GND (power), 16 XTAL2 (out), 17 XTAL1 (in), 18 PD0 (OC0B/SCL/INT0) (io), 19 PD1 (SDA/INT1) (io), 20 PD2 (RXD1/INT2) (io), 21 PD3 (TXD1/INT3) (io), 22 PD5 (XCK1/~{CTS}) (io), 23 GND (power), 24 AVCC (power), 25 PD4 (ICP1/ADC8) (io), 26 PD6 (T1/~{OC4D}/ADC9) (io), 27 PD7 (T0/OC4D/ADC10) (io), 28 PB4 (PCINT4/ADC11) (io), 29 PB5 (PCINT5/OC1A/~{OC4B}/ADC12) (io), 30 PB6 (PCINT6/OC1B/OC4B/ADC13) (io), 31 PC6 (OC3A/~{OC4A}) (io), 32 PC7 (ICP3/CLK0/OC4A) (io), 33 PE2 (~{HWB}) (io), 34 VCC (power), 35 GND (power), 36 PF7 (ADC7/TDI) (io), 37 PF6 (ADC6/TDO) (io), 38 PF5 (ADC5/TMS) (io), 39 PF4 (ADC4/TCK) (io), 40 PF1 (ADC1) (io), 41 PF0 (ADC0) (io), 42 AREF (in), 43 GND (power), 44 AVCC (power)